# Altium footprint library BWRC.PcbLib: 51 footprints (part 4 of 4)
Each footprint in its own frame and in the unit in brackets; x right, y up, seen from the top. Pads: shape width x height; smd on the part's side, far side on the other; paste and mask are expansions set on the pad; w line width, h text height; cw(c..) or ccw(c..) is an arc to the next point about the centre after c.
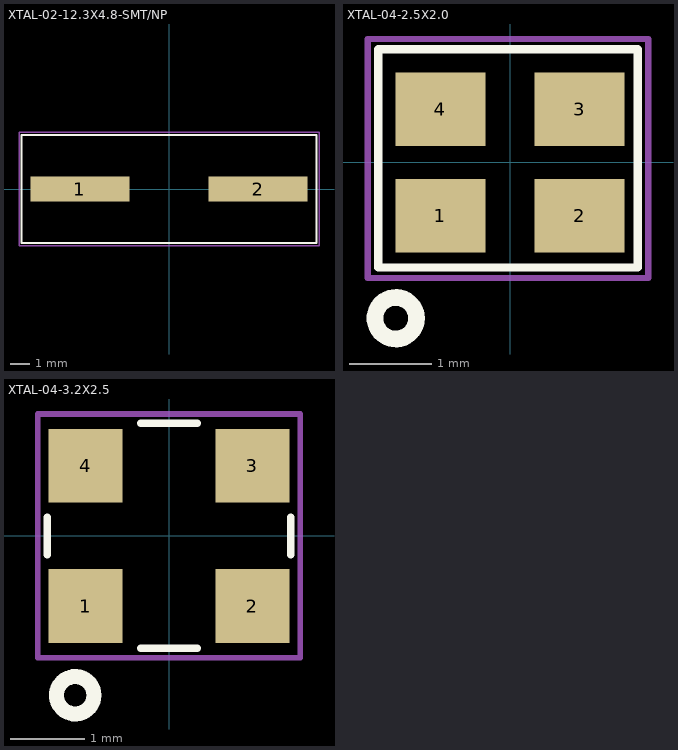
[diagram p3: the footprints below, top view; thin cyan lines are the x and y axes]

## XTAL-02-12.3X4.8-SMT/NP [mm]
pads (2):
  rect 5.1x1.3 smd: 1(-4.6,0) 2(4.6,0)
Top Overlay:
  lines w0.102: -7.62,-2.794 7.62,-2.794 7.62,2.794 -7.62,2.794 -7.62,-2.794
M15_Courtyard_Top:
  lines w0.076: -7.747,-2.921 -7.747,2.921 7.747,2.921 7.747,-2.921 -7.747,-2.921

## XTAL-04-2.5X2.0 [mm]
height 2.54
pads (4):
  rect 1.1x0.9 smd: 1(-0.85,-0.65) 2(0.85,-0.65) 3(0.85,0.65) 4(-0.85,0.65)
Top Overlay:
  circle w0.203: c-1.397,-1.905 r0.254
  lines w0.102: -1.612,-1.285 1.563,-1.285 1.563,1.382 -1.612,1.382 -1.612,-1.285
M15_Courtyard_Top:
  lines w0.076: -1.739,-1.412 1.69,-1.412 1.69,1.509 -1.739,1.509 -1.739,-1.412

## XTAL-04-3.2X2.5 [mm]
pads (4):
  rect 1x1 smd: 1(-1.13,-0.95) 2(1.13,-0.95) 3(1.13,0.95) 4(-1.13,0.95)
Top Overlay:
  circle w0.203: c-1.27,-2.159 r0.254
  lines w0.102: -1.651,-0.254 -1.651,0.254 ; -0.381,-1.524 0.381,-1.524 ; -0.381,1.524 0.381,1.524 ; 1.651,-0.254 1.651,0.254
M15_Courtyard_Top:
  lines w0.076: -1.778,-1.651 -1.778,1.651 1.778,1.651 1.778,-1.651 -1.778,-1.651